# Altium footprint library alex_footprint.PcbLib: 262 footprints (part 16 of 17)
Each footprint in its own frame and in the unit in brackets; x right, y up, seen from the top. Pads: shape width x height; smd on the part's side, far side on the other; paste and mask are expansions set on the pad; w line width, h text height; cw(c..) or ccw(c..) is an arc to the next point about the centre after c.
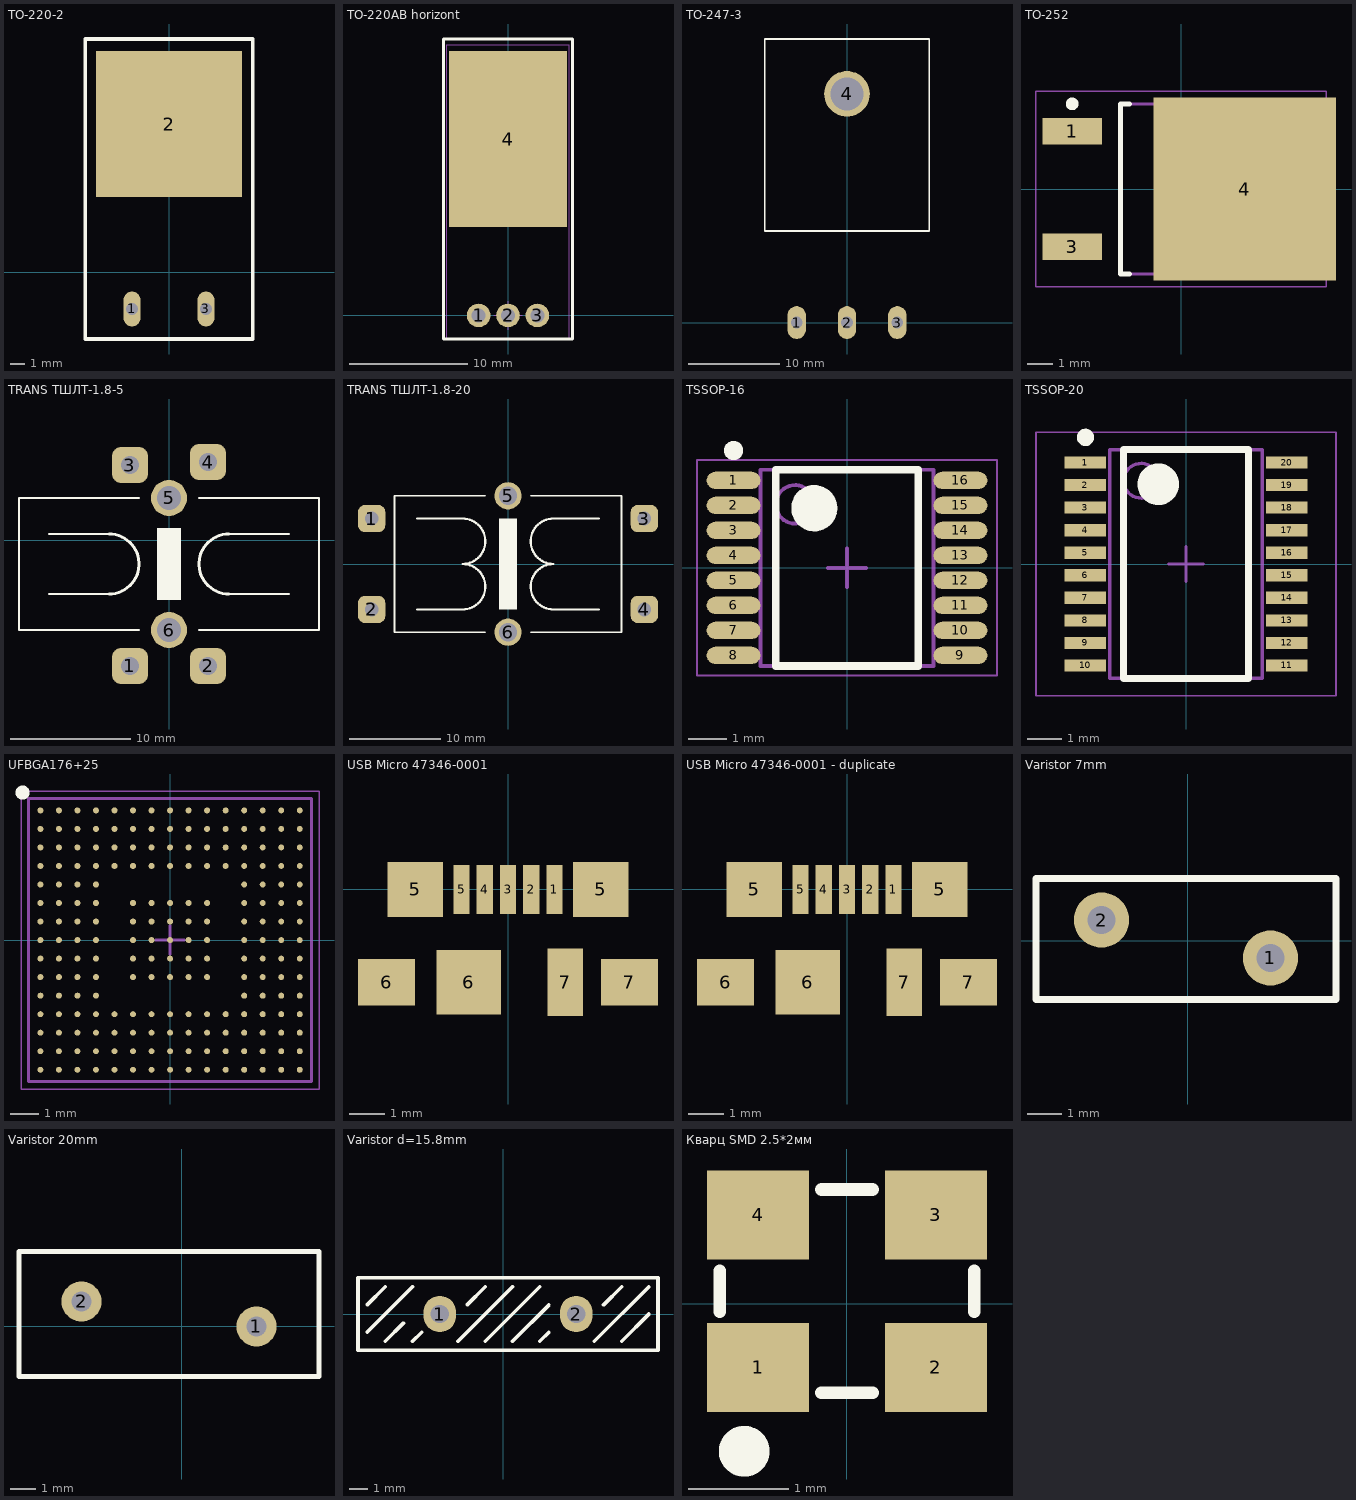
[diagram p15: the footprints below, top view; thin cyan lines are the x and y axes]

## TO-220-2 [mm]
pads (3):
  oval 1.2x2.4 hole 0.8 unplated: 1(-2.54,-2.54) 3(2.54,-2.54)
  rect 10x10 smd: 2(0,10.16)
Top Overlay:
  lines w0.254: -5.75,-4.6 -5.75,16 5.75,16 5.75,-4.6 2.875,-4.6 -2.875,-4.6 -5.75,-4.6

## TO-220AB horizont [mm] "КТ-28-2"
height 15
pads (4):
  round 2 hole 1.2: 1(-2.5,0) 2(0,0) 3(2.5,0)
  rect 10x15 smd: 4(0,15)
Top Overlay:
  lines w0.25: -5.5,-2 5.5,-2 5.5,23.5 -5.5,23.5 -5.5,-2
Mechanical 13:
  lines w0.1: -5.5,-2 -5.5,23.5 5.5,23.5 5.5,-2 -5.5,-2
Mechanical 15:
  lines w0.1: -1.2,0 1.2,0 ; 0,-1.2 0,1.2 ; -5.2,-2 5.2,-2 5.2,23 -5.2,23 -5.2,-2
3D body "User Library-TO-220-4.STEP": height 26.06, standoff -2.74, extent -5.1,-1.9 5.1,2.6

## TO-247-3 [mm]
pads (4):
  oval 2x3.6 hole 1.3 unplated mask+0.25: 1(-5.5,0) 2(0,0) 3(5.5,0)
  round 5 hole 3.6 unplated mask+0.25: 4(0,25)
Top Overlay:
  lines w0.2: -9,10 9,10 9,31 -8,31 -9,31 -9,10

## TO-252 [mm] "D-PAK, 3-Pads, Body 6,20x6,72mm (max), IPC Medium Density"
height 2.3
pads (3):
  rect 2.35x1.05 smd: 1(-4.3,2.28) 3(-4.3,-2.28)
  rect 7.2x7.2 smd: 4(2.5,0)
Top Overlay:
  circle w0.25: c-4.3,3.355 r0.125
  lines w0.2: -2.05,-3.35 -2.4,-3.35 -2.4,3.35 -2.05,3.35
Mechanical 13:
  lines w0.1: -2.4,-3.35 3.8,-3.35 3.8,3.35 -2.4,3.35 -2.4,-3.35
Mechanical 15:
  lines w0.05: -5.725,-3.85 5.725,-3.85 5.725,3.85 -5.725,3.85 -5.725,-3.85
  lines w0.1: -0.5,0 0.5,0 ; 0,-0.5 0,0.5
3D body: height 2.3, standoff 0, extent -2.4,-3.35 5.5,3.35

## TRANS ТШЛТ-1.8-5 [mm]
pads (6):
  rrect50% 3x3 hole 1.5 unplated mask+0.25: 1(-3.25,-10.5) 2(3.25,-10.5) 3(-3.25,6.25) 4(3.25,6.5)
  round 3 hole 2 unplated mask+0.25: 5(0,3.5) 6(0,-7.5)
Top Overlay:
  rectangle: -1,-5 1,1
  lines w0.2: -10,-4.5 -5,-4.5 ; -10,0.5 -5,0.5 ; -2.5,-7.5 -12.5,-7.5 -12.5,3.5 -2.5,3.5 ; 2.5,-7.5 12.5,-7.5 12.5,3.5 2.5,3.5 ; 5,-4.5 10,-4.5 ; 5,0.5 10,0.5
  lines w0.25: -5,-4.5 ccw(c-5,-2) -5,0.5 ; 5,-4.5 cw(c5,-2) 5,0.5

## TRANS ТШЛТ-1.8-20 [mm]
pads (6):
  rrect50% 3x3 hole 1.5 unplated mask+0.25: 1(-15,5) 2(-15,-5) 3(15,5) 4(15,-5)
  round 3 hole 2 unplated mask+0.25: 5(0,7.5) 6(0,-7.5)
Top Overlay:
  rectangle: -1,-5 1,5
  lines w0.2: -10,-5 -5,-5 ; -10,5 -5,5 ; -2.5,-7.5 -12.5,-7.5 -12.5,7.5 -2.5,7.5 ; 2.5,-7.5 12.5,-7.5 12.5,7.5 2.5,7.5 ; 5,-5 10,-5 ; 5,5 10,5
  lines w0.25: -5,-5 ccw(c-5,-2.5) -5,0 ccw(c-5,2.5) -5,5 ; 5,-5 cw(c5,-2.5) 5,0 cw(c5,2.5) 5,5

## TSSOP-16 [mm] "TSOP, 16-Leads, Body 5,00x4,40mm, Pitch 0,65mm, IPC Medium Density"
height 1.2
pads (16):
  oval 1.4x0.45 smd: 1(-2.95,2.275) 2(-2.95,1.625) 3(-2.95,0.975) 4(-2.95,0.325) 5(-2.95,-0.325) 6(-2.95,-0.975) 7(-2.95,-1.625) 8(-2.95,-2.275) 9(2.95,-2.275) 10(2.95,-1.625) 11(2.95,-0.975) 12(2.95,-0.325) 13(2.95,0.325) 14(2.95,0.975) 15(2.95,1.625) 16(2.95,2.275)
Top Overlay:
  circle w0.25: c-2.95,3.05 r0.125
  circle w0.6: c-0.85,1.55 r0.3
  lines w0.2: -1.85,-2.55 -1.85,2.55 1.85,2.55 1.85,-2.55 -1.85,-2.55
Mechanical 13:
  circle w0.1: c-1.35,1.65 r0.5
  lines w0.1: -2.25,-2.55 -2.25,2.55 2.25,2.55 2.25,-2.55 -2.25,-2.55
Mechanical 15:
  lines w0.05: -3.9,-2.8 -3.9,2.8 3.9,2.8 3.9,-2.8 -3.9,-2.8
  lines w0.1: -0.5,0 0.5,0 ; 0,-0.5 0,0.5
3D body: height 1.2, standoff 0.1, extent -2.25,-2.55 2.25,2.55

## TSSOP-20 [mm]
height 1.2
pads (20):
  rect 1.2x0.35 smd: 1(-2.9,2.925) 2(-2.9,2.275) 3(-2.9,1.625) 4(-2.9,0.975) 5(-2.9,0.325) 6(-2.9,-0.325) 7(-2.9,-0.975) 8(-2.9,-1.625) 9(-2.9,-2.275) 10(-2.9,-2.925) 11(2.9,-2.925) 12(2.9,-2.275) 13(2.9,-1.625) 14(2.9,-0.975) 15(2.9,-0.325) 16(2.9,0.325) 17(2.9,0.975) 18(2.9,1.625) 19(2.9,2.275) 20(2.9,2.925)
Top Overlay:
  circle w0.25: c-2.9,3.65 r0.125
  circle w0.6: c-0.8,2.3 r0.3
  lines w0.2: -1.8,-3.3 -1.8,3.3 1.8,3.3 1.8,-3.3 -1.8,-3.3
Mechanical 13:
  circle w0.1: c-1.3,2.4 r0.5
  lines w0.1: -2.2,-3.3 -2.2,3.3 2.2,3.3 2.2,-3.3 -2.2,-3.3
Mechanical 15:
  lines w0.05: -4.325,-3.8 -4.325,3.8 4.325,3.8 4.325,-3.8 -4.325,-3.8
  lines w0.1: -0.5,0 0.5,0 ; 0,-0.5 0,0.5
3D body: height 1.2, standoff 0.05, extent -2.2,-3.3 2.2,3.3

## UFBGA176+25 [mm] "BGA, 225-Leads, Body 9,93x9,93mmx0,60mm, Pitch 0,65mm"
height 0.6
pads (201):
  round 0.21 smd: A1(-4.55,4.55) A2(-3.9,4.55) A3(-3.25,4.55) A4(-2.6,4.55) A5(-1.95,4.55) A6(-1.3,4.55) A7(-0.65,4.55) A8(0,4.55) A9(0.65,4.55) A10(1.3,4.55) A11(1.95,4.55) A12(2.6,4.55) A13(3.25,4.55) A14(3.9,4.55) A15(4.55,4.55) B1(-4.55,3.9) B2(-3.9,3.9) B3(-3.25,3.9) B4(-2.6,3.9) B5(-1.95,3.9) B6(-1.3,3.9) B7(-0.65,3.9) B8(0,3.9) B9(0.65,3.9) B10(1.3,3.9) B11(1.95,3.9) B12(2.6,3.9) B13(3.25,3.9) B14(3.9,3.9) B15(4.55,3.9) C1(-4.55,3.25) C2(-3.9,3.25) C3(-3.25,3.25) C4(-2.6,3.25) C5(-1.95,3.25) C6(-1.3,3.25) C7(-0.65,3.25) C8(0,3.25) C9(0.65,3.25) C10(1.3,3.25) C11(1.95,3.25) C12(2.6,3.25) C13(3.25,3.25) C14(3.9,3.25) C15(4.55,3.25) D1(-4.55,2.6) D2(-3.9,2.6) D3(-3.25,2.6) D4(-2.6,2.6) D5(-1.95,2.6) D6(-1.3,2.6) D7(-0.65,2.6) D8(0,2.6) D9(0.65,2.6) D10(1.3,2.6) D11(1.95,2.6) D12(2.6,2.6) D13(3.25,2.6) D14(3.9,2.6) D15(4.55,2.6) E1(-4.55,1.95) E2(-3.9,1.95) E3(-3.25,1.95) E4(-2.6,1.95) E12(2.6,1.95) E13(3.25,1.95) E14(3.9,1.95) E15(4.55,1.95) F1(-4.55,1.3) F2(-3.9,1.3) F3(-3.25,1.3) F4(-2.6,1.3) F6(-1.3,1.3) F7(-0.65,1.3) F8(0,1.3) F9(0.65,1.3) F10(1.3,1.3) F12(2.6,1.3) F13(3.25,1.3) F14(3.9,1.3) F15(4.55,1.3) G1(-4.55,0.65) G2(-3.9,0.65) G3(-3.25,0.65) G4(-2.6,0.65) G6(-1.3,0.65) G7(-0.65,0.65) G8(0,0.65) G9(0.65,0.65) G10(1.3,0.65) G12(2.6,0.65) G13(3.25,0.65) G14(3.9,0.65) G15(4.55,0.65) H1(-4.55,0) H2(-3.9,0) H3(-3.25,0) H4(-2.6,0) H6(-1.3,0) H7(-0.65,0) H8(0,0) H9(0.65,0) H10(1.3,0) H12(2.6,0) H13(3.25,0) H14(3.9,0) H15(4.55,0) J1(-4.55,-0.65) J2(-3.9,-0.65) J3(-3.25,-0.65) J4(-2.6,-0.65) J6(-1.3,-0.65) J7(-0.65,-0.65) J8(0,-0.65) J9(0.65,-0.65) J10(1.3,-0.65) J12(2.6,-0.65) J13(3.25,-0.65) J14(3.9,-0.65) J15(4.55,-0.65) K1(-4.55,-1.3) K2(-3.9,-1.3) K3(-3.25,-1.3) K4(-2.6,-1.3) K6(-1.3,-1.3) K7(-0.65,-1.3) K8(0,-1.3) K9(0.65,-1.3) K10(1.3,-1.3) K12(2.6,-1.3) K13(3.25,-1.3) K14(3.9,-1.3) K15(4.55,-1.3) L1(-4.55,-1.95) L2(-3.9,-1.95) L3(-3.25,-1.95) L4(-2.6,-1.95) L12(2.6,-1.95) L13(3.25,-1.95) L14(3.9,-1.95) L15(4.55,-1.95) M1(-4.55,-2.6) M2(-3.9,-2.6) M3(-3.25,-2.6) M4(-2.6,-2.6) M5(-1.95,-2.6) M6(-1.3,-2.6) M7(-0.65,-2.6) M8(0,-2.6) M9(0.65,-2.6) M10(1.3,-2.6) M11(1.95,-2.6) M12(2.6,-2.6) M13(3.25,-2.6) M14(3.9,-2.6) M15(4.55,-2.6) N1(-4.55,-3.25) N2(-3.9,-3.25) N3(-3.25,-3.25) N4(-2.6,-3.25) N5(-1.95,-3.25) N6(-1.3,-3.25) N7(-0.65,-3.25) N8(0,-3.25) N9(0.65,-3.25) N10(1.3,-3.25) N11(1.95,-3.25) N12(2.6,-3.25) N13(3.25,-3.25) N14(3.9,-3.25) N15(4.55,-3.25) P1(-4.55,-3.9) P2(-3.9,-3.9) P3(-3.25,-3.9) P4(-2.6,-3.9) P5(-1.95,-3.9) P6(-1.3,-3.9) P7(-0.65,-3.9) P8(0,-3.9) P9(0.65,-3.9) P10(1.3,-3.9) P11(1.95,-3.9) P12(2.6,-3.9) P13(3.25,-3.9) P14(3.9,-3.9) P15(4.55,-3.9) R1(-4.55,-4.55) R2(-3.9,-4.55) R3(-3.25,-4.55) R4(-2.6,-4.55) R5(-1.95,-4.55) R6(-1.3,-4.55) R7(-0.65,-4.55) R8(0,-4.55) R9(0.65,-4.55) R10(1.3,-4.55) R11(1.95,-4.55) R12(2.6,-4.55) R13(3.25,-4.55) R14(3.9,-4.55) R15(4.55,-4.55)
Top Overlay:
  circle w0.25: c-5.175,5.175 r0.125
Mechanical 13:
  lines w0.1: -4.965,-4.965 4.965,-4.965 4.965,4.965 -4.965,4.965 -4.965,-4.965
Mechanical 15:
  lines w0.05: -5.225,-5.225 5.225,-5.225 5.225,5.225 -5.225,5.225 -5.225,-5.225
  lines w0.1: -0.5,0 0.5,0 ; 0,-0.5 0,0.5
3D body: height 0.6, standoff 0.05, extent -4.965,-4.965 4.965,4.965

## USB Micro 47346-0001 [mm]
pads (11):
  rect 0.45x1.38 smd mask+0.25: 1(1.3,0) 2(0.65,0) 3(0,0) 4(-0.65,0) 5(-1.3,0)
  rect 1.55x1.55 smd mask+0.25: 5(-2.6,0) 5(2.6,0)
  rect 1.6x1.3 smd mask+0.25: 6(-3.4,-2.6) 7(3.4,-2.6)
  rect 1.8x1.8 smd mask+0.25: 6(-1.1,-2.6)
  rect 1x1.9 smd mask+0.25: 7(1.6,-2.6)
3D body "473460001.stp": height 2.67, standoff -0.27, extent -3.99,-5.28 3.99,0.15

## USB Micro 47346-0001 - duplicate [mm]
pads (11):
  rect 0.45x1.38 smd mask+0.25: 1(1.3,0) 2(0.65,0) 3(0,0) 4(-0.65,0) 5(-1.3,0)
  rect 1.55x1.55 smd mask+0.25: 5(-2.6,0) 5(2.6,0)
  rect 1.6x1.3 smd mask+0.25: 6(-3.4,-2.6) 7(3.4,-2.6)
  rect 1.8x1.8 smd mask+0.25: 6(-1.1,-2.6)
  rect 1x1.9 smd mask+0.25: 7(1.6,-2.6)
3D body "473460001.stp": height 2.67, standoff -0.27, extent -3.99,-5.28 3.99,0.15

## USOP-8 [mm]

## Varistor 7mm [mm]
pads (2):
  round 1.6 hole 0.8 unplated: 1(2.4,-0.5) 2(-2.5,0.6)
Top Overlay:
  lines w0.2: -4.4,-1.7 -4.4,1.8 4.3,1.8 4.3,-1.7 -4.4,-1.7

## Varistor 20mm [mm]
pads (2):
  round 1.6 hole 0.8 unplated: 1(3,0) 2(-4,1)
Top Overlay:
  lines w0.2: -6.5,-2 5.5,-2 5.5,3 -6.5,3 -6.5,-2

## Varistor d=15.8mm [mm]
pads (2):
  oval 1.8x2 hole 1 unplated mask+0.25: 1(-3.5,0) 2(4,0)
Top Overlay:
  lines w0.2: -7.5,-1 -5,1.5 ; -7.5,0.5 -6.5,1.5 ; -6.5,-1.5 -5.5,-0.5 ; -5,-1.5 -4.5,-1 ; -2.5,-1.5 0.5,1.5 ; -2,0.5 -1,1.5 ; -1,-1.5 2,1.5 ; 2,-1.5 2.5,-1 ; 2.5,0.5 0.5,-1.5 ; 5,-1.5 8,1.5 ; 5.5,0.5 6.5,1.5 ; 6.5,-1.5 8,0 ; 0.5,-1.5 0.5,-1.5 ; 2,1.5 2,1.5 ; -8,-2 -8,0 -8,2 7,2 8.5,2 8.5,-2 -8,-2

## Кварц SMD 2.5*2мм [mil]
pads (4):
  rect 40x35 smd mask+2: 1(-35,-25) 2(35,-25) 3(35,35) 4(-35,35)
Top Overlay:
  circle w10: c-40.43,-57.99 r5
  lines w5: -50,-3 -50,13 ; -10,-35 10,-35 ; -10,45 10,45 ; 50,-3 50,13